# Altium footprint library PcbLibLafe.PcbLib: 297 footprints (part 16 of 19)
Each footprint in its own frame and in the unit in brackets; x right, y up, seen from the top. Pads: shape width x height; smd on the part's side, far side on the other; paste and mask are expansions set on the pad; w line width, h text height; cw(c..) or ccw(c..) is an arc to the next point about the centre after c.
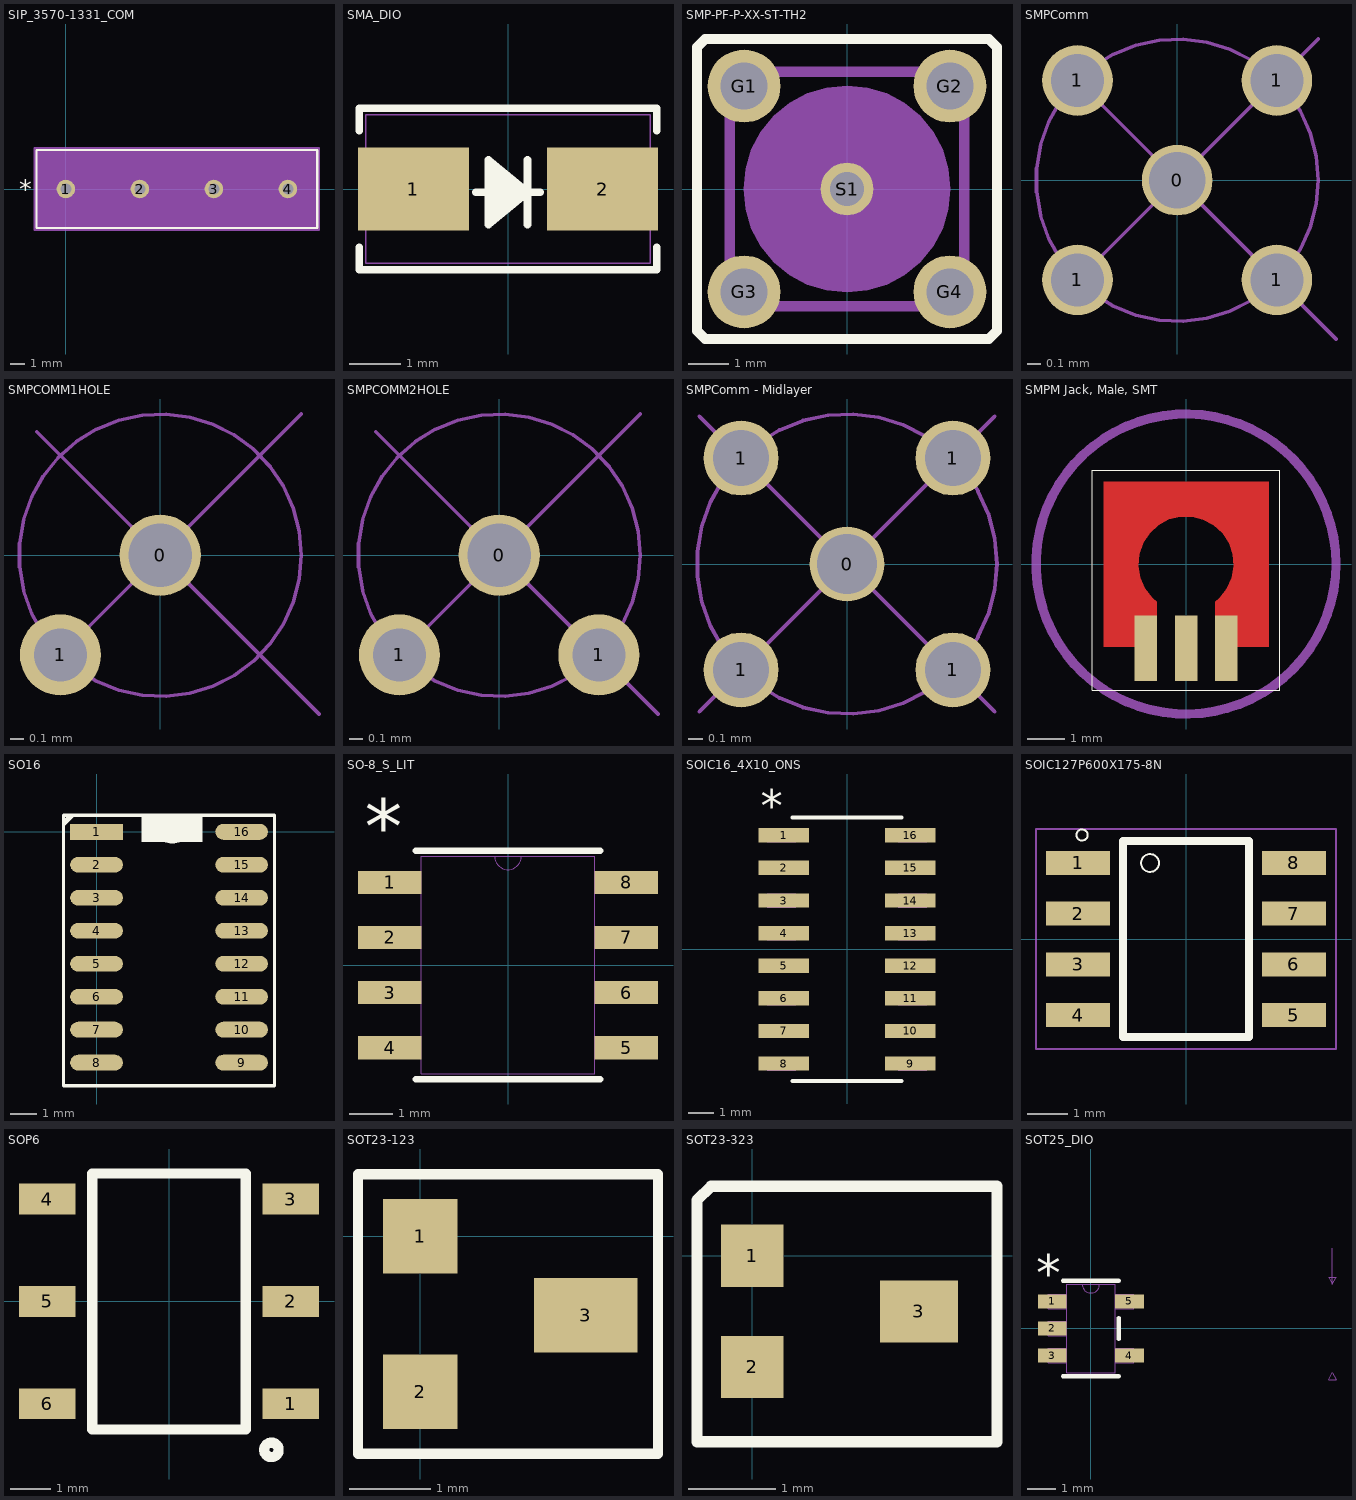
[diagram p15: the footprints below, top view; thin cyan lines are the x and y axes]

## SIP_3570-1331_COM [mil]
pads (4):
  round 50 / inner round 60 / far side round 50 hole 30 paste-99999 mask+0: 1(0,0) 2(200,0) 3(400,0) 4(600,0)
Top Overlay:
  lines w6: -79,-105 679,-105 679,105 -79,105 -79,-105
  text "*" at -126.5,-25 h50
Mechanical 13:
  lines w1: -74,-100 674,-100 674,100 -74,100 -74,-100
  text "*" at -76.5,-25 h50
Mechanical 15:
  region: 684,-110 -84,-110 -84,110 684,110
  lines w6: -84,-110 -84,110 684,110 684,-110 -84,-110
3D body "SIP_3570-1331_COM.step": height 130, standoff -352.99, extent -74.02,-100 674.02,100

## SMA_DIO [mm]
height 2.032
pads (2):
  rect 2.18x1.63 smd paste+0 mask+0: 1(-1.857,0) 2(1.857,0)
Top Overlay:
  lines w0.152: -2.922,-1.148 -2.922,-1.587 2.922,-1.587 2.922,-1.148 ; -2.922,1.148 -2.922,1.587 2.922,1.587 2.922,1.148 ; -0.635,-0.064 0.635,-0.064 ; -0.381,-0.572 0.381,-0.064 ; -0.381,-0.445 0.381,-0.064 ; -0.381,-0.318 0.381,-0.064 ; -0.381,-0.191 0.381,-0.064 ; -0.381,0.064 0.381,-0.064 ; -0.381,0.191 0.381,-0.064 ; -0.381,0.318 0.381,-0.064 ; -0.381,0.445 0.381,-0.064 ; 0.381,-0.699 0.381,0.572 ; 0.381,-0.064 -0.381,0.572 -0.381,-0.699 0.381,-0.064
Mechanical 13:
  lines w0.025: -0.635,-0.064 0.635,-0.064 ; -0.381,-0.572 0.381,-0.064 ; -0.381,-0.445 0.381,-0.064 ; -0.381,-0.318 0.381,-0.064 ; -0.381,-0.191 0.381,-0.064 ; -0.381,0.064 0.381,-0.064 ; -0.381,0.191 0.381,-0.064 ; -0.381,0.318 0.381,-0.064 ; -0.381,0.445 0.381,-0.064 ; 0.381,-0.699 0.381,0.572 ; 0.381,-0.064 -0.381,0.572 -0.381,-0.699 0.381,-0.064 ; -2.795,-1.46 2.795,-1.46 2.795,1.46 -2.795,1.46 -2.795,-1.46
3D body "SMA_DIO.step": height 2.35, standoff 0, extent -2.795,-1.46 2.795,1.46

## SMP-PF-P-XX-ST-TH2 [mm]
pads (5):
  round 1.8 hole 1.17 mask+0.075: G1(-2.54,2.54) G2(2.54,2.54) G3(-2.54,-2.54) G4(2.54,-2.54)
  round 1.3 hole 0.85 mask+0.075: S1(0,0)
Top Overlay:
  lines w0.254: -3.7,-3.5 -3.5,-3.7 3.5,-3.7 3.7,-3.5 3.7,3.5 3.5,3.7 -3.5,3.7 -3.7,3.5 -3.7,-3.5
Mechanical 1:
  lines w0.254: -2.89,-2.89 2.89,-2.89 2.89,2.89 -2.89,2.89 -2.89,-2.89
  text "J1" at -0.497,4.192 h0.76
Mechanical 3:
  pour cut-out: 2.552,0 2.503,0.498 2.358,0.977 2.122,1.418 1.805,1.805 1.418,2.122 0.977,2.358 0.498,2.503 0,2.552 -0.498,2.503 -0.977,2.358 -1.418,2.122 -1.805,1.805 -2.122,1.418 -2.358,0.977 -2.503,0.498 -2.552,0 -2.503,-0.498 -2.358,-0.977 -2.122,-1.418 -1.805,-1.805 -1.418,-2.122 -0.977,-2.358 -0.498,-2.503 0,-2.552 0.498,-2.503 0.977,-2.358 1.418,-2.122 1.805,-1.805 2.122,-1.418 2.358,-0.977 2.503,-0.498

## SMPComm [mil]
pads (5):
  round 20 hole 16: 0(0,0)
  round 20 hole 15: 1(-28.25,-28.25) 1(-28.25,28.25) 1(28.25,-28.25) 1(28.25,28.25)
Mechanical 9:
  circle w1: c0,0 r40
  lines w1: -35,-35 40,40 ; -35,35 45,-45

## SMPCOMM1HOLE [mil]
pads (2):
  round 23 hole 18: 0(0,0)
  round 23 hole 15: 1(-28.25,-28.25)
Mechanical 9:
  circle w1: c0,0 r40
  lines w1: -35,-35 40,40 ; -35,35 45,-45

## SMPCOMM2HOLE [mil]
pads (3):
  round 23 hole 18: 0(0,0)
  round 23 hole 15: 1(-28.25,-28.25) 1(28.25,-28.25)
Mechanical 9:
  circle w1: c0,0 r40
  lines w1: -35,-35 40,40 ; -35,35 45,-45

## SMPComm - Midlayer [mil]
pads (5):
  round 20 hole 16: 0(0,0)
  round 20 hole 15: 1(-28.25,-28.25) 1(-28.25,28.25) 1(28.25,-28.25) 1(28.25,28.25)
Mechanical 9:
  circle w1: c0,0 r40
  lines w1: -39.37,-39.37 39.37,39.37 ; -39.37,39.37 39.37,-39.37

## SMPM Jack, Male, SMT [mil] "925-204J-51PT"
pads (3):
  rect 24x70 smd: ""(-43,-90) ""(0,-90) ""(43,-90)
Top Layer:
  region: -88,-88 -88,88 88,88 88,-88 31,-88 31,-55 31.19,-54.81 31.19,-40.4 35.95,-36.23 43.73,-26.29 48.83,-14.75 50.94,-2.31 49.94,10.27 45.87,22.22 39,32.8 29.74,41.38 18.66,47.41 6.43,50.54 -6.19,50.57 -18.43,47.5 -29.54,41.52 -38.85,33 -45.77,22.45 -49.9,10.52 -50.97,-2.06 -48.91,-14.51 -43.87,-26.07 -36.14,-36.05 -31.4,-40.24 -31,-40.65 -31,-88
Top Overlay:
  lines w1: -100,-134.5 -100,100 100,100 100,-134.5 -100,-134.5
Top Solder:
  rectangle: -96,-129 96,95
Mechanical 3:
  circle w10: c0,0 r160
3D body "925-143J-51P.stp": height 107, standoff -1, extent -78,-112.98 78,78
3D body "SM8802_3D.step": height 719, standoff 49.71, extent -139.76,-125.98 139.76,125.98

## SO16 [mil]
pads (16):
  rect 80x24 smd: 1(0,0)
  oval 80x24 smd: 2(0,-50) 3(0,-100) 4(0,-150) 5(0,-200) 6(0,-250) 7(0,-300) 8(0,-350) 9(220,-350) 10(220,-300) 11(220,-250) 12(220,-200) 13(220,-150) 14(220,-100) 15(220,-50) 16(220,0)
Top Overlay:
  rectangle: 67.91,-15.75 160.43,24.98
  lines w5: -35.12,24.98 -50.12,9.98 -50.12,14.98 -40.12,24.98 -50.12,24.98 ; 74.88,24.98 ccw(c114.88,24.98) 154.88,24.98 ; -50.12,24.98 269.88,24.98 269.88,-385.02 -50.12,-385.02 -50.12,24.98
3D body: height 60, standoff 10, extent 25,-385 195,25
3D body: height 20, standoff 0, extent -20,-8 7,7
3D body: height 35, standoff 15, extent -6.5,-8 26,7
3D body: height 35, standoff 15, extent -6.5,-58 26,-43
3D body: height 20, standoff 0, extent -20,-58 7,-43
3D body: height 35, standoff 15, extent -6.5,-108 26,-93
3D body: height 20, standoff 0, extent -20,-108 7,-93
3D body: height 35, standoff 15, extent -6.5,-158 26,-143
3D body: height 20, standoff 0, extent -20,-158 7,-143
3D body: height 35, standoff 15, extent 194,-157 226.5,-142
3D body: height 20, standoff 0, extent 213,-157 240,-142
3D body: height 35, standoff 15, extent 194,-107 226.5,-92
3D body: height 20, standoff 0, extent 213,-107 240,-92
3D body: height 35, standoff 15, extent 194,-57 226.5,-42
3D body: height 20, standoff 0, extent 213,-57 240,-42
3D body: height 35, standoff 15, extent 194,-7 226.5,8
3D body: height 20, standoff 0, extent 213,-7 240,8
3D body: height 20, standoff 0, extent -20,-208 7,-193
3D body: height 35, standoff 15, extent -6.5,-208 26,-193
3D body: height 35, standoff 15, extent -6.5,-258 26,-243
3D body: height 20, standoff 0, extent -20,-258 7,-243
3D body: height 35, standoff 15, extent -6.5,-308 26,-293
3D body: height 20, standoff 0, extent -20,-308 7,-293
3D body: height 35, standoff 15, extent 194,-307 226.5,-292
3D body: height 20, standoff 0, extent 213,-307 240,-292
3D body: height 35, standoff 15, extent 194,-257 226.5,-242
3D body: height 20, standoff 0, extent 213,-257 240,-242
3D body: height 35, standoff 15, extent 194,-207 226.5,-192
3D body: height 20, standoff 0, extent 213,-207 240,-192
3D body: height 61, standoff 60, extent 36,-9 55.92,10.96
3D body: height 61, standoff 60, extent 68,-12 152,22
3D body: height 20, standoff 0, extent 213,-357 240,-342
3D body: height 35, standoff 15, extent 194,-357 226.5,-342
3D body: height 20, standoff 0, extent -20,-358 7,-343
3D body: height 35, standoff 15, extent -6.5,-358 26,-343

## SO-8_S_LIT [mil]
pads (8):
  rect 57.5x21 smd paste+0 mask+0: 1(-107.25,75) 2(-107.25,25) 3(-107.25,-25) 4(-107.25,-75) 5(107.25,-75) 6(107.25,-25) 7(107.25,25) 8(107.25,75)
Top Overlay:
  lines w6: -83.5,-103.5 83.5,-103.5 ; -83.5,103.5 83.5,103.5
  text "*" at -130,101 h50
Mechanical 13:
  lines w0: -12,98.5 ccw(c0,98.5) 12,98.5
  lines w1: -122,-84.5 -78.5,-84.5 -78.5,-65.5 -122,-65.5 -122,-84.5 ; -122,-34.5 -78.5,-34.5 -78.5,-15.5 -122,-15.5 -122,-34.5 ; -122,15.5 -78.5,15.5 -78.5,34.5 -122,34.5 -122,15.5 ; -122,65.5 -78.5,65.5 -78.5,84.5 -122,84.5 -122,65.5 ; -78.5,-98.5 -78.5,98.5 78.5,98.5 78.5,-98.5 -78.5,-98.5 ; 78.5,-84.5 122,-84.5 122,-65.5 78.5,-65.5 78.5,-84.5 ; 78.5,-34.5 122,-34.5 122,-15.5 78.5,-15.5 78.5,-34.5 ; 78.5,15.5 122,15.5 122,34.5 78.5,34.5 78.5,15.5 ; 78.5,65.5 122,65.5 122,84.5 78.5,84.5 78.5,65.5
  text "*" at -76,45.5 h50
3D body "SO-8_S_LIT.step": height 69.09, standoff 0, extent -122,-98.5 122.01,98.51
3D body: height 10, standoff 0, extent 0,0 10,10

## SOIC16_4X10_ONS [mil]
pads (16):
  rect 78x22 smd paste+0 mask+0: 1(-97,175) 2(-97,125) 3(-97,75) 4(-97,25) 5(-97,-25) 6(-97,-75) 7(-97,-125) 8(-97,-175) 9(97,-175) 10(97,-125) 11(97,-75) 12(97,-25) 13(97,25) 14(97,75) 15(97,125) 16(97,175)
Top Overlay:
  lines w6: -83.5,-202 83.5,-202 ; -83.5,202 83.5,202
  text "*" at -132,196 h50
Mechanical 13:
  lines w1: -122,-185 -78.5,-185 -78.5,-165 -122,-165 -122,-185 ; -122,-135 -78.5,-135 -78.5,-115 -122,-115 -122,-135 ; -122,-85 -78.5,-85 -78.5,-65 -122,-65 -122,-85 ; -122,-35 -78.5,-35 -78.5,-15 -122,-15 -122,-35 ; -122,15 -78.5,15 -78.5,35 -122,35 -122,15 ; -122,65 -78.5,65 -78.5,85 -122,85 -122,65 ; -122,115 -78.5,115 -78.5,135 -122,135 -122,115 ; -122,165 -78.5,165 -78.5,185 -122,185 -122,165 ; 78.5,-185 122,-185 122,-165 78.5,-165 78.5,-185 ; 78.5,-135 122,-135 122,-115 78.5,-115 78.5,-135 ; 78.5,-85 122,-85 122,-65 78.5,-65 78.5,-85 ; 78.5,-35 122,-35 122,-15 78.5,-15 78.5,-35 ; 78.5,15 122,15 122,35 78.5,35 78.5,15 ; 78.5,65 122,65 122,85 78.5,85 78.5,65 ; 78.5,115 122,115 122,135 78.5,135 78.5,115 ; 78.5,165 122,165 122,185 78.5,185 78.5,165
3D body "SOIC16_4X10_ONS.step": height 69.09, standoff 0, extent -122,-197 122.01,197.01
3D body: height 10, standoff 0, extent 0,0 10,10

## SOIC127P600X175-8N [mm]
pads (8):
  rect 1.6x0.6 smd: 1(-2.7,1.905) 2(-2.7,0.635) 3(-2.7,-0.635) 4(-2.7,-1.905) 5(2.7,-1.905) 6(2.7,-0.635) 7(2.7,0.635) 8(2.7,1.905)
Top Overlay:
  circle w0.05: c-2.6,2.6 r0.141
  circle w0.05: c-0.9,1.9 r0.224
  lines w0.2: -1.575,-2.45 -1.575,2.45 1.575,2.45 1.575,-2.45 -1.575,-2.45
Mechanical 15:
  lines w0.05: -3.75,-2.75 -3.75,2.75 3.75,2.75 3.75,-2.75 -3.75,-2.75

## SOP6 [mil]
pads (6):
  rect 55x30 smd: 1(119,-100) 2(119,0) 3(119,100) 4(-119,100) 5(-119,0) 6(-119,-100)
Top Overlay:
  circle w10: c100,-145 r7.07
  lines w10: -75,-125 75,-125 75,125 -75,125 -75,-125

## SOT23-123 [mil]
pads (3):
  rect 36x36 smd: 1(0,0) 2(0,-75)
  rect 50x36 smd: 3(80,-38)
Top Overlay:
  lines w5: -30,-105 115,-105 115,30 -30,30 -30,-105
3D body "SW3dPS-3-lead sot23-3.STEP": height 40.59, standoff 0.43, extent -3.48,-95 94,19.96

## SOT23-323 [mil]
pads (3):
  rect 28x28 smd: 1(0,0) 2(0,-50)
  rect 35x28 smd: 3(75,-25)
Top Overlay:
  lines w5: -24.88,11.02 -24.88,12.02 ; -24.88,15.02 -24.88,25.02 ; -24.88,25.02 -24.88,-83.66 110.12,-83.66 110.12,31.3 -18.6,31.3 -24.88,25.02
3D body "SW3dPS-3-lead sot23-3.STEP": height 40.59, standoff 0.43, extent -5.43,-83.66 92.05,31.3

## SOT25_DIO [mm]
pads (5):
  rect 1.006x0.5 smd paste+0 mask+0: 1(-1.353,0.95) 2(-1.353,0) 3(-1.353,-0.95) 4(1.353,-0.95) 5(1.353,0.95)
Top Overlay:
  lines w0.152: -0.977,-1.677 0.977,-1.677 ; -0.977,1.677 0.977,1.677 ; 0.977,-0.367 0.977,0.367
  text "*" at -1.924,1.323 h1.27
Mechanical 7:
  lines w0.025: 8.47,2.82 8.47,1.55 ; 8.47,1.55 8.597,1.804 8.343,1.804 8.47,1.55 ; 8.343,-1.804 8.597,-1.804 8.47,-1.55 8.343,-1.804
  text "0.122in/3.1mm" at 8.978,-0.318 h0.64
Mechanical 13:
  lines w0: -0.305,1.55 ccw(c0,1.55) 0.305,1.55
  lines w0.025: -1.5,-1.2 -0.85,-1.2 -0.85,-0.7 -1.5,-0.7 -1.5,-1.2 ; -1.5,-0.25 -0.85,-0.25 -0.85,0.25 -1.5,0.25 -1.5,-0.25 ; -1.5,0.7 -0.85,0.7 -0.85,1.2 -1.5,1.2 -1.5,0.7 ; -0.85,-1.55 -0.85,1.55 0.85,1.55 0.85,-1.55 -0.85,-1.55 ; 0.85,-1.2 1.5,-1.2 1.5,-0.7 0.85,-0.7 0.85,-1.2 ; 0.85,0.7 1.5,0.7 1.5,1.2 0.85,1.2 0.85,0.7
  text "*" at -0.914,0.231 h1.27
3D body "SOT25_DIO.step": height -0.74, standoff -2.19, extent -1.5,-1.55 1.5,1.55
3D body: height 0.25, standoff 0, extent 0,0 0.254,0.254